# Altium footprint library heromap.PcbLib: 593 footprints (part 35 of 38)
Each footprint in its own frame and in the unit in brackets; x right, y up, seen from the top. Pads: shape width x height; smd on the part's side, far side on the other; paste and mask are expansions set on the pad; w line width, h text height; cw(c..) or ccw(c..) is an arc to the next point about the centre after c.
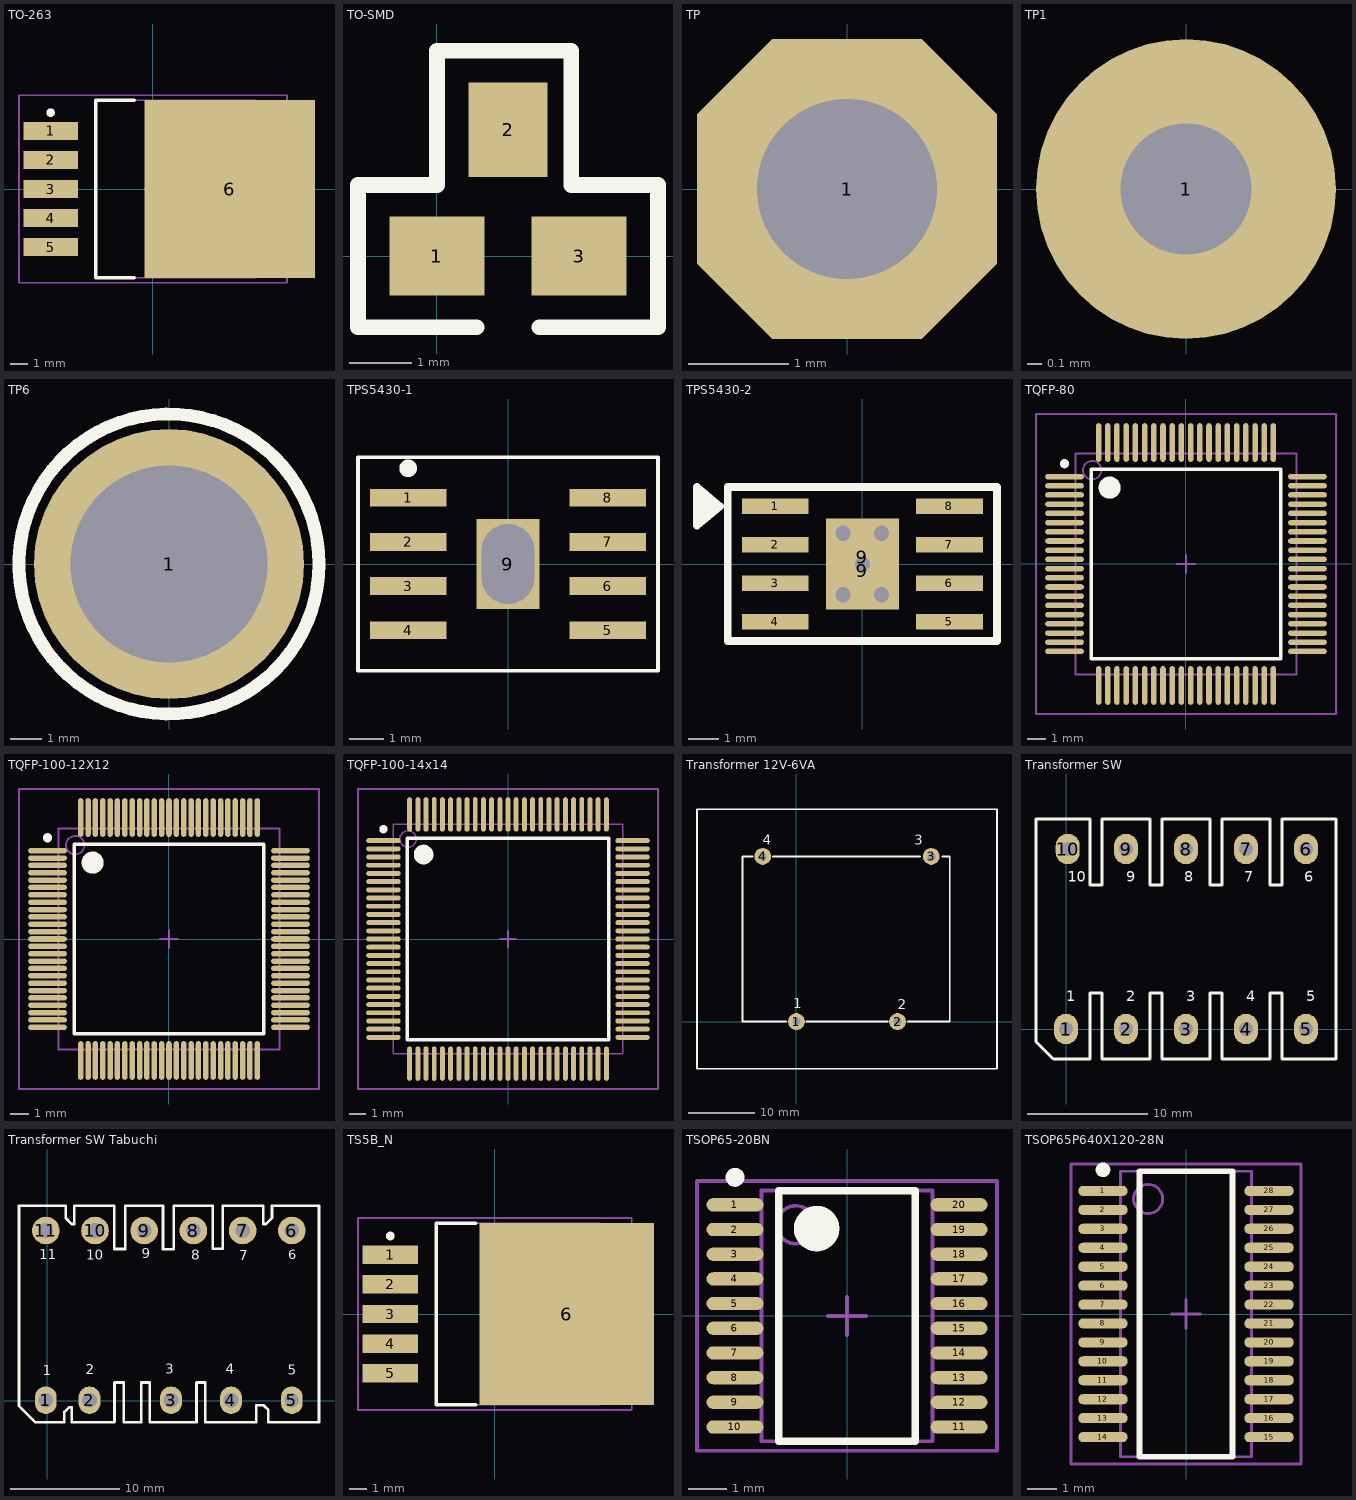
[diagram p34: the footprints below, top view; thin cyan lines are the x and y axes]

## TO-263 [mm]
pads (6):
  rect 3.2x1.05 smd: 1(-6,3.4) 2(-6,1.7) 3(-6,0) 4(-6,-1.7) 5(-6,-3.4)
  rect 10x10.45 smd: 6(4.5,0)
Top Overlay:
  circle w0.25: c-6,4.475 r0.125
  lines w0.2: -1.1,-5.2 -3.35,-5.2 -3.35,5.2 -1.1,5.2
Mechanical 13:
  lines w0.1: -3.35,-5.2 6.05,-5.2 6.05,5.2 -3.35,5.2 -3.35,-5.2
Mechanical 15:
  lines w0.1: -0.5,0 0.5,0 ; 0,-0.5 0,0.5 ; -7.85,-5.5 7.85,-5.5 7.85,5.5 -7.85,5.5 -7.85,-5.5
3D body: height 4.65, standoff 0, extent -3.35,-5.2 6.05,5.2
3D body: height 0.5, standoff 0, extent -6.566,2.832 -4.305,3.924
3D body: height 2, standoff 0, extent -4.953,2.832 -4.293,3.924
3D body: height 2, standoff 1.5, extent -4.953,2.845 -3.251,3.937
3D body: height 2, standoff 1.5, extent -4.966,1.156 -3.264,2.248
3D body: height 2, standoff 0, extent -4.966,1.143 -4.305,2.235
3D body: height 0.5, standoff 0, extent -6.579,1.143 -4.318,2.235
3D body: height 0.5, standoff 0, extent -6.553,-2.286 -4.293,-1.194
3D body: height 2, standoff 0, extent -4.94,-2.286 -4.28,-1.194
3D body: height 2, standoff 1.5, extent -4.94,-2.273 -3.238,-1.181
3D body: height 2, standoff 1.5, extent -4.928,-0.584 -3.226,0.508
3D body: height 2, standoff 0, extent -4.928,-0.597 -4.267,0.495
3D body: height 0.5, standoff 0, extent -6.54,-0.597 -4.28,0.495
3D body: height 2, standoff 1.5, extent -4.953,-3.937 -3.251,-2.845
3D body: height 2, standoff 0, extent -4.953,-3.95 -4.293,-2.857
3D body: height 0.5, standoff 0, extent -6.566,-3.95 -4.305,-2.857
3D body: height 0.5, standoff 0, extent 6.05,-5.2 7.569,5.2

## TO-SMD [mil]
pads (3):
  rect 60x50 smd: 1(0,0) 3(90,0)
  rect 50x60 smd: 2(45,80)
Top Overlay:
  lines w10: 25,-45 -50,-45 -50,45 0,45 0,115 0,130 85,130 85,115 85,45 140,45 140,-45 65,-45

## TP [mm] "Connect 1"
pads (1):
  oct 3x3 hole 1.8: 1(0,0)

## TP1 [mil] "Test point"
height 150
pads (1):
  round 80 hole 35: 1(0,0)

## TP6 [mm] "Jac cap 6ly"
height 3.81
pads (1):
  round 8.5 hole 6.2: 1(0,0)
Top Overlay:
  circle w0.406: c0,0 r4.724

## TPS5430-1 [mm]
pads (9):
  rect 2.2x0.508 smd: 1(-2.875,1.905) 2(-2.875,0.635) 3(-2.875,-0.635) 4(-2.875,-1.905) 5(2.875,-1.905) 6(2.875,-0.635) 7(2.875,0.635) 8(2.875,1.905)
  rect 1.8x2.6 hole 1.5 slot 2.3 at 90 deg: 9(0,0)
Top Overlay:
  circle w0.254: c-2.875,2.755 r0.127
  lines w0.102: -4.318,-3.069 -4.318,3.069 4.318,3.069 4.318,-3.069 -4.318,-3.069
3D body: height 1.69, standoff 0, extent -1.544,1.041 -0.546,2.039
3D body: height 1.68, standoff 0.25, extent -1.995,-2.49 1.995,2.49
3D body: height 0.89, standoff 0.79, extent -2.286,1.676 -1.778,2.134
3D body: height 0.89, standoff 0, extent -2.388,1.676 -2.286,2.134
3D body: height 0.1, standoff 0, extent -3.327,1.676 -2.388,2.134
3D body: height 0.1, standoff 0, extent -3.327,0.406 -2.388,0.864
3D body: height 0.89, standoff 0, extent -2.388,0.406 -2.286,0.864
3D body: height 0.89, standoff 0.79, extent -2.286,0.406 -1.778,0.864
3D body: height 0.1, standoff 0, extent -3.327,-0.864 -2.388,-0.406
3D body: height 0.89, standoff 0, extent -2.388,-0.864 -2.286,-0.406
3D body: height 0.89, standoff 0.79, extent -2.286,-0.864 -1.778,-0.406
3D body: height 0.1, standoff 0, extent -3.327,-2.134 -2.388,-1.676
3D body: height 0.89, standoff 0, extent -2.388,-2.134 -2.286,-1.676
3D body: height 0.89, standoff 0.79, extent -2.286,-2.134 -1.778,-1.676
3D body: height 0.89, standoff 0.79, extent 1.778,1.676 2.286,2.134
3D body: height 0.89, standoff 0, extent 2.286,1.676 2.388,2.134
3D body: height 0.1, standoff 0, extent 2.388,1.676 3.327,2.134
3D body: height 0.89, standoff 0.79, extent 1.778,0.406 2.286,0.864
3D body: height 0.89, standoff 0, extent 2.286,0.406 2.388,0.864
3D body: height 0.1, standoff 0, extent 2.388,0.406 3.327,0.864
3D body: height 0.89, standoff 0.79, extent 1.778,-0.864 2.286,-0.406
3D body: height 0.89, standoff 0, extent 2.286,-0.864 2.388,-0.406
3D body: height 0.1, standoff 0, extent 2.388,-0.864 3.327,-0.406
3D body: height 0.1, standoff 0, extent 2.388,-2.134 3.327,-1.676
3D body: height 0.89, standoff 0, extent 2.286,-2.134 2.388,-1.676
3D body: height 0.89, standoff 0.79, extent 1.778,-2.134 2.286,-1.676

## TPS5430-2 [mm]
pads (10):
  rect 2.2x0.508 smd: 1(-2.875,1.905) 2(-2.875,0.635) 3(-2.875,-0.635) 4(-2.875,-1.905) 5(2.875,-1.905) 6(2.875,-0.635) 7(2.875,0.635) 8(2.875,1.905)
  rect 2.413x2.54 smd: 9(0,-0.229) 9(0,0.229)
via -0.635,1.016 diameter 0.9 hole 0.5
via 0.635,-1.016 diameter 0.9 hole 0.5
via 0.635,1.016 diameter 0.9 hole 0.5
via -0.635,-1.016 diameter 0.9 hole 0.5
via 0,0 diameter 0.9 hole 0.5
Top Overlay:
  region: -4.699,1.905 -5.461,2.54 -5.461,1.27
  lines w0.254: -5.461,1.27 -4.699,1.905 -5.461,2.54 -5.461,1.27 ; -4.445,-2.54 -4.445,2.54 4.445,2.54 4.445,-2.54 -4.445,-2.54
3D body: height 1.69, standoff 0, extent -1.554,1.031 -0.536,2.049
3D body: height 1.68, standoff 0.25, extent -1.995,-2.49 1.995,2.49
3D body: height 0.89, standoff 0.79, extent -2.286,1.676 -1.778,2.134
3D body: height 0.89, standoff 0, extent -2.388,1.676 -2.286,2.134
3D body: height 0.1, standoff 0, extent -3.327,1.676 -2.388,2.134
3D body: height 0.1, standoff 0, extent -3.327,0.406 -2.388,0.864
3D body: height 0.89, standoff 0, extent -2.388,0.406 -2.286,0.864
3D body: height 0.89, standoff 0.79, extent -2.286,0.406 -1.778,0.864
3D body: height 0.1, standoff 0, extent -3.327,-0.864 -2.388,-0.406
3D body: height 0.89, standoff 0, extent -2.388,-0.864 -2.286,-0.406
3D body: height 0.89, standoff 0.79, extent -2.286,-0.864 -1.778,-0.406
3D body: height 0.1, standoff 0, extent -3.327,-2.134 -2.388,-1.676
3D body: height 0.89, standoff 0, extent -2.388,-2.134 -2.286,-1.676
3D body: height 0.89, standoff 0.79, extent -2.286,-2.134 -1.778,-1.676
3D body: height 0.89, standoff 0.79, extent 1.778,1.676 2.286,2.134
3D body: height 0.89, standoff 0, extent 2.286,1.676 2.388,2.134
3D body: height 0.1, standoff 0, extent 2.388,1.676 3.327,2.134
3D body: height 0.89, standoff 0.79, extent 1.778,0.406 2.286,0.864
3D body: height 0.89, standoff 0, extent 2.286,0.406 2.388,0.864
3D body: height 0.1, standoff 0, extent 2.388,0.406 3.327,0.864
3D body: height 0.89, standoff 0.79, extent 1.778,-0.864 2.286,-0.406
3D body: height 0.89, standoff 0, extent 2.286,-0.864 2.388,-0.406
3D body: height 0.1, standoff 0, extent 2.388,-0.864 3.327,-0.406
3D body: height 0.1, standoff 0, extent 2.388,-2.134 3.327,-1.676
3D body: height 0.89, standoff 0, extent 2.286,-2.134 2.388,-1.676
3D body: height 0.89, standoff 0.79, extent 1.778,-2.134 2.286,-1.676

## TQFP-80 [mm] "Thin QFP, 80-Leads, Body 12x12mm, Pitch 0.5mm, IPC Low Density"
height 1.2
pads (80):
  oval 2.1x0.3 smd: 1(-6.6,4.75) 2(-6.6,4.25) 3(-6.6,3.75) 4(-6.6,3.25) 5(-6.6,2.75) 6(-6.6,2.25) 7(-6.6,1.75) 8(-6.6,1.25) 9(-6.6,0.75) 10(-6.6,0.25) 11(-6.6,-0.25) 12(-6.6,-0.75) 13(-6.6,-1.25) 14(-6.6,-1.75) 15(-6.6,-2.25) 16(-6.6,-2.75) 17(-6.6,-3.25) 18(-6.6,-3.75) 19(-6.6,-4.25) 20(-6.6,-4.75) 41(6.6,-4.75) 42(6.6,-4.25) 43(6.6,-3.75) 44(6.6,-3.25) 45(6.6,-2.75) 46(6.6,-2.25) 47(6.6,-1.75) 48(6.6,-1.25) 49(6.6,-0.75) 50(6.6,-0.25) 51(6.6,0.25) 52(6.6,0.75) 53(6.6,1.25) 54(6.6,1.75) 55(6.6,2.25) 56(6.6,2.75) 57(6.6,3.25) 58(6.6,3.75) 59(6.6,4.25) 60(6.6,4.75)
  oval 0.3x2.1 smd: 21(-4.75,-6.6) 22(-4.25,-6.6) 23(-3.75,-6.6) 24(-3.25,-6.6) 25(-2.75,-6.6) 26(-2.25,-6.6) 27(-1.75,-6.6) 28(-1.25,-6.6) 29(-0.75,-6.6) 30(-0.25,-6.6) 31(0.25,-6.6) 32(0.75,-6.6) 33(1.25,-6.6) 34(1.75,-6.6) 35(2.25,-6.6) 36(2.75,-6.6) 37(3.25,-6.6) 38(3.75,-6.6) 39(4.25,-6.6) 40(4.75,-6.6) 61(4.75,6.6) 62(4.25,6.6) 63(3.75,6.6) 64(3.25,6.6) 65(2.75,6.6) 66(2.25,6.6) 67(1.75,6.6) 68(1.25,6.6) 69(0.75,6.6) 70(0.25,6.6) 71(-0.25,6.6) 72(-0.75,6.6) 73(-1.25,6.6) 74(-1.75,6.6) 75(-2.25,6.6) 76(-2.75,6.6) 77(-3.25,6.6) 78(-3.75,6.6) 79(-4.25,6.6) 80(-4.75,6.6)
Top Overlay:
  circle w0.6: c-4.15,4.15 r0.3
  circle w0.25: c-6.6,5.45 r0.125
  lines w0.2: -5.15,-5.15 5.15,-5.15 5.15,5.15 -5.15,5.15 -5.15,-5.15
Mechanical 13:
  circle w0.1: c-5.1,5.1 r0.5
  lines w0.1: -6,-6 6,-6 6,6 -6,6 -6,-6
Mechanical 15:
  lines w0.1: -0.5,0 0.5,0 ; 0,-0.5 0,0.5 ; -8.15,-8.15 8.15,-8.15 8.15,8.15 -8.15,8.15 -8.15,-8.15
3D body: height 1.2, standoff 0, extent -6,-6 6,6

## TQFP-100-12X12 [mm] "Shrink QFP, 100-Leads, Body 12x12mm, Pitch 0.4mm, IPC High Density"
height 2.2
pads (100):
  oval 2.1x0.3 smd: 1(-6.6,4.8) 2(-6.6,4.4) 3(-6.6,4) 4(-6.6,3.6) 5(-6.6,3.2) 6(-6.6,2.8) 7(-6.6,2.4) 8(-6.6,2) 9(-6.6,1.6) 10(-6.6,1.2) 11(-6.6,0.8) 12(-6.6,0.4) 13(-6.6,0) 14(-6.6,-0.4) 15(-6.6,-0.8) 16(-6.6,-1.2) 17(-6.6,-1.6) 18(-6.6,-2) 19(-6.6,-2.4) 20(-6.6,-2.8) 21(-6.6,-3.2) 22(-6.6,-3.6) 23(-6.6,-4) 24(-6.6,-4.4) 25(-6.6,-4.8) 51(6.6,-4.8) 52(6.6,-4.4) 53(6.6,-4) 54(6.6,-3.6) 55(6.6,-3.2) 56(6.6,-2.8) 57(6.6,-2.4) 58(6.6,-2) 59(6.6,-1.6) 60(6.6,-1.2) 61(6.6,-0.8) 62(6.6,-0.4) 63(6.6,0) 64(6.6,0.4) 65(6.6,0.8) 66(6.6,1.2) 67(6.6,1.6) 68(6.6,2) 69(6.6,2.4) 70(6.6,2.8) 71(6.6,3.2) 72(6.6,3.6) 73(6.6,4) 74(6.6,4.4) 75(6.6,4.8)
  oval 0.3x2.1 smd: 26(-4.8,-6.6) 27(-4.4,-6.6) 28(-4,-6.6) 29(-3.6,-6.6) 30(-3.2,-6.6) 31(-2.8,-6.6) 32(-2.4,-6.6) 33(-2,-6.6) 34(-1.6,-6.6) 35(-1.2,-6.6) 36(-0.8,-6.6) 37(-0.4,-6.6) 38(0,-6.6) 39(0.4,-6.6) 40(0.8,-6.6) 41(1.2,-6.6) 42(1.6,-6.6) 43(2,-6.6) 44(2.4,-6.6) 45(2.8,-6.6) 46(3.2,-6.6) 47(3.6,-6.6) 48(4,-6.6) 49(4.4,-6.6) 50(4.8,-6.6) 76(4.8,6.6) 77(4.4,6.6) 78(4,6.6) 79(3.6,6.6) 80(3.2,6.6) 81(2.8,6.6) 82(2.4,6.6) 83(2,6.6) 84(1.6,6.6) 85(1.2,6.6) 86(0.8,6.6) 87(0.4,6.6) 88(0,6.6) 89(-0.4,6.6) 90(-0.8,6.6) 91(-1.2,6.6) 92(-1.6,6.6) 93(-2,6.6) 94(-2.4,6.6) 95(-2.8,6.6) 96(-3.2,6.6) 97(-3.6,6.6) 98(-4,6.6) 99(-4.4,6.6) 100(-4.8,6.6)
Top Overlay:
  circle w0.25: c-6.6,5.5 r0.125
  circle w0.6: c-4.15,4.15 r0.3
  lines w0.2: -5.15,-5.15 -5.15,5.15 5.15,5.15 5.15,-5.15 -5.15,-5.15
Mechanical 13:
  circle w0.1: c-5.1,5.1 r0.5
  lines w0.1: -6,-6 -6,6 6,6 6,-6 -6,-6
Mechanical 15:
  lines w0.1: -0.5,0 0.5,0 ; 0,-0.5 0,0.5 ; -8.15,-8.15 -8.15,8.15 8.15,8.15 8.15,-8.15 -8.15,-8.15
3D body: height 2.2, standoff 0, extent -6,-6 6,6

## TQFP-100-14x14 [mm] "Thin QFP, 100-Leads, Body 14x14mm, Pitch 0.5mm, IPC Low Density"
height 1.6
pads (100):
  oval 2.1x0.3 smd: 1(-7.6,6) 2(-7.6,5.5) 3(-7.6,5) 4(-7.6,4.5) 5(-7.6,4) 6(-7.6,3.5) 7(-7.6,3) 8(-7.6,2.5) 9(-7.6,2) 10(-7.6,1.5) 11(-7.6,1) 12(-7.6,0.5) 13(-7.6,0) 14(-7.6,-0.5) 15(-7.6,-1) 16(-7.6,-1.5) 17(-7.6,-2) 18(-7.6,-2.5) 19(-7.6,-3) 20(-7.6,-3.5) 21(-7.6,-4) 22(-7.6,-4.5) 23(-7.6,-5) 24(-7.6,-5.5) 25(-7.6,-6) 51(7.6,-6) 52(7.6,-5.5) 53(7.6,-5) 54(7.6,-4.5) 55(7.6,-4) 56(7.6,-3.5) 57(7.6,-3) 58(7.6,-2.5) 59(7.6,-2) 60(7.6,-1.5) 61(7.6,-1) 62(7.6,-0.5) 63(7.6,0) 64(7.6,0.5) 65(7.6,1) 66(7.6,1.5) 67(7.6,2) 68(7.6,2.5) 69(7.6,3) 70(7.6,3.5) 71(7.6,4) 72(7.6,4.5) 73(7.6,5) 74(7.6,5.5) 75(7.6,6)
  oval 0.3x2.1 smd: 26(-6,-7.6) 27(-5.5,-7.6) 28(-5,-7.6) 29(-4.5,-7.6) 30(-4,-7.6) 31(-3.5,-7.6) 32(-3,-7.6) 33(-2.5,-7.6) 34(-2,-7.6) 35(-1.5,-7.6) 36(-1,-7.6) 37(-0.5,-7.6) 38(0,-7.6) 39(0.5,-7.6) 40(1,-7.6) 41(1.5,-7.6) 42(2,-7.6) 43(2.5,-7.6) 44(3,-7.6) 45(3.5,-7.6) 46(4,-7.6) 47(4.5,-7.6) 48(5,-7.6) 49(5.5,-7.6) 50(6,-7.6) 76(6,7.6) 77(5.5,7.6) 78(5,7.6) 79(4.5,7.6) 80(4,7.6) 81(3.5,7.6) 82(3,7.6) 83(2.5,7.6) 84(2,7.6) 85(1.5,7.6) 86(1,7.6) 87(0.5,7.6) 88(0,7.6) 89(-0.5,7.6) 90(-1,7.6) 91(-1.5,7.6) 92(-2,7.6) 93(-2.5,7.6) 94(-3,7.6) 95(-3.5,7.6) 96(-4,7.6) 97(-4.5,7.6) 98(-5,7.6) 99(-5.5,7.6) 100(-6,7.6)
Top Overlay:
  circle w0.25: c-7.6,6.7 r0.125
  circle w0.6: c-5.15,5.15 r0.3
  lines w0.2: -6.15,-6.15 -6.15,6.15 6.15,6.15 6.15,-6.15 -6.15,-6.15
Mechanical 13:
  circle w0.1: c-6.1,6.1 r0.5
  lines w0.1: -7,-7 -7,7 7,7 7,-7 -7,-7
Mechanical 15:
  lines w0.1: -0.5,0 0.5,0 ; 0,-0.5 0,0.5 ; -9.15,-9.15 -9.15,9.15 9.15,9.15 9.15,-9.15 -9.15,-9.15
3D body: height 1.6, standoff 0, extent -7,-7 7,7

## Transformer 12V-6VA [mm] "Transformer; 4 Leads"
pads (4):
  round 2.54 hole 1.2: 1(0,0) 2(15.24,0) 3(20.32,24.892) 4(-5.08,24.892)
Top Overlay:
  lines w0.254: -6.604,24.892 -8.128,24.892 -8.128,24.638 -8.128,0.254 -8.128,0 -1.524,0 ; -3.556,24.892 18.669,24.892 ; 1.524,0 13.716,0 ; 16.764,0 23.114,0 23.114,0.254 23.114,24.638 23.114,24.892 21.971,24.892 ; -14.986,-7.112 -14.986,32.004 30.226,32.004 30.226,-7.112 -14.986,-7.112
  text "3" at 17.78,26.67 h1.5
  text "4" at -5.08,26.67 h1.5
  text "2" at 15.24,1.882 h1.5
  text "1" at -0.508,2.032 h1.5
3D body: height 31, standoff 20, extent -8.128,0 23.114,24.892
3D body: height 26, standoff 1, extent -14.986,-7.112 30.226,32.004
3D body: height 1, standoff -4, extent -5.576,24.393 -4.58,25.391
3D body: height 1, standoff -4, extent 19.824,24.393 20.82,25.391
3D body: height 1, standoff -4, extent 14.744,-0.499 15.74,0.499
3D body: height 1, standoff -4, extent -0.496,-0.499 0.5,0.499

## Transformer SW [mm] "Transformer; 4 Leads"
pads (10):
  oval 2x2.54 hole 1.2: 1(0,0) 2(5,0) 3(10,0) 4(15,0) 5(20,0) 6(20,15) 7(15,15) 8(10,15) 9(5,15) 10(0.142,15)
Top Overlay:
  lines w0.254: -2.5,-1.056 -2.5,17.5 2,17.5 2,12 3,12 3,17.5 7,17.5 7,12 8,12 8,17.5 12,17.5 12,12 13,12 13,17.5 17,17.5 17,12 18,12 18,17.5 22.5,17.5 22.5,-2.5 18,-2.5 18,3 17,3 17,-2.5 13,-2.5 13,3 12,3 12,-2.5 8,-2.5 8,3 7,3 7,-2.5 3,-2.5 3,3 2,3 2,-2.5 -1.056,-2.5 -2.5,-1.056
  text "10" at 0.142,12 h1.52
  text "9" at 5,12 h1.52
  text "8" at 9.873,12 h1.52
  text "7" at 14.873,12 h1.52
  text "6" at 19.873,12 h1.52
  text "5" at 20,2 h1.52
  text "4" at 15,2 h1.52
  text "3" at 10,2.032 h1.52
  text "2" at 5,2.032 h1.52
  text "1" at 0,2.032 h1.5
3D body: height 1, standoff -4, extent -0.496,-0.499 0.5,0.499

## Transformer SW Tabuchi [mil] "Transformer; 4 Leads"
pads (11):
  oval 78.74x100 hole 53.15: 1(-5,1) 2(153,1) 3(448,1) 4(665,1) 5(885,1)
  round 100 hole 53.15: 6(885,615) 7(707,615) 8(529,615) 9(351,615) 10(173,615) 11(-5,615)
Top Overlay:
  lines w10: 89,-79 243,-79 ; 89,-77 89,-24 80,-24 62,-42 62,-79 -43,-79 -102,-20 -102,705 67,705 67,660 88,639 98,639 98,705 243,705 243,548 282,548 282,705 419,705 419,547 458,547 458,705 599,705 599,549 635,549 635,705 782,705 782,639 792,639 813,660 813,705 983.43,705 983.43,-79 800,-79 800,-34 783,-17 756,-17 756,-79 572,-79 572,65 540,65 540,-79 371,-79 371,65 340,65 340,-79 277,-79 277,65 244,65 244,-68.98 244,-76 243,-77
  text "11" at -28,498 h60
  text "5" at 871,80 h60
  text "4" at 646,84 h60
  text "3" at 428,85 h60
  text "2" at 140,82 h60
  text "1" at -16,78 h60
  text "10" at 141,497 h60
  text "9" at 343,502 h60
  text "8" at 521,496 h60
  text "7" at 694,494 h60
  text "6" at 873,499 h59.06
3D body: height 748.03, standoff 236.22, extent 80.5,-80 800.5,700
3D body: height 39.37, standoff -157.48, extent 687.31,595.36 726.53,634.64
3D body: height 39.37, standoff -157.48, extent 509.31,595.36 548.53,634.64
3D body: height 39.37, standoff -157.48, extent 331.31,595.36 370.53,634.64
3D body: height 39.37, standoff -157.48, extent 153.31,595.36 192.53,634.64
3D body: height 39.37, standoff -157.48, extent -24.69,595.36 14.53,634.64
3D body: height 39.37, standoff -157.48, extent -24.69,-18.64 14.53,20.64
3D body: height 39.37, standoff -157.48, extent 133.31,-18.64 172.53,20.64
3D body: height 39.37, standoff -157.48, extent 428.31,-18.64 467.53,20.64
3D body: height 39.37, standoff -157.48, extent 645.31,-18.64 684.53,20.64
3D body: height -748.03, standoff -826.77, extent -103,-80 984,705
3D body: height 39.37, standoff -157.48, extent 865.31,-18.64 904.53,20.64
3D body: height 39.37, standoff -157.48, extent 865.31,595.36 904.53,634.64
3D body: height -39.37, standoff -196.85, extent -103,-80 984,705
3D body: height 830.71, standoff 39.37, extent -110,230 990,420

## TS5B_N [mm]
pads (6):
  rect 3.2x1.05 smd: 1(-6,3.4) 2(-6,1.7) 3(-6,0) 4(-6,-1.7) 5(-6,-3.4)
  rect 10x10.45 smd: 6(4.131,0)
Top Overlay:
  circle w0.25: c-6,4.475 r0.125
  lines w0.2: -1.1,-5.2 -3.35,-5.2 -3.35,5.2 -1.1,5.2
Mechanical 13:
  lines w0.1: -3.35,-5.2 6.05,-5.2 6.05,5.2 -3.35,5.2 -3.35,-5.2
Mechanical 15:
  lines w0.1: -0.5,0 0.5,0 ; 0,-0.5 0,0.5 ; -7.85,-5.5 7.85,-5.5 7.85,5.5 -7.85,5.5 -7.85,-5.5
3D body: height 4.65, standoff 0, extent -3.35,-5.2 6.05,5.2
3D body: height 0.5, standoff 0, extent -6.566,2.832 -4.305,3.924
3D body: height 2, standoff 0, extent -4.953,2.832 -4.293,3.924
3D body: height 2, standoff 1.5, extent -4.953,2.845 -3.251,3.937
3D body: height 2, standoff 1.5, extent -4.966,1.156 -3.264,2.248
3D body: height 2, standoff 0, extent -4.966,1.143 -4.305,2.235
3D body: height 0.5, standoff 0, extent -6.579,1.143 -4.318,2.235
3D body: height 0.5, standoff 0, extent -6.553,-2.286 -4.293,-1.194
3D body: height 2, standoff 0, extent -4.94,-2.286 -4.28,-1.194
3D body: height 2, standoff 1.5, extent -4.94,-2.273 -3.238,-1.181
3D body: height 2, standoff 1.5, extent -4.928,-0.584 -3.226,0.508
3D body: height 2, standoff 0, extent -4.928,-0.597 -4.267,0.495
3D body: height 0.5, standoff 0, extent -6.54,-0.597 -4.28,0.495
3D body: height 2, standoff 1.5, extent -4.953,-3.937 -3.251,-2.845
3D body: height 2, standoff 0, extent -4.953,-3.95 -4.293,-2.857
3D body: height 0.5, standoff 0, extent -6.566,-3.95 -4.305,-2.857

## TSOP65-20BN [mm] "TSOP, 20-Leads, Body 6.5x4.4mm, Pitch 0.65mm, IPC Medium Density"
height 1.2
pads (20):
  oval 1.5x0.35 smd: 1(-2.95,2.925) 2(-2.95,2.275) 3(-2.95,1.625) 4(-2.95,0.975) 5(-2.95,0.325) 6(-2.95,-0.325) 7(-2.95,-0.975) 8(-2.95,-1.625) 9(-2.95,-2.275) 10(-2.95,-2.925) 11(2.95,-2.925) 12(2.95,-2.275) 13(2.95,-1.625) 14(2.95,-0.975) 15(2.95,-0.325) 16(2.95,0.325) 17(2.95,0.975) 18(2.95,1.625) 19(2.95,2.275) 20(2.95,2.925)
Top Overlay:
  circle w0.25: c-2.95,3.65 r0.125
  circle w0.6: c-0.8,2.3 r0.3
  lines w0.2: -1.8,-3.3 -1.8,3.3 1.8,3.3 1.8,-3.3 -1.8,-3.3
Mechanical 13:
  circle w0.1: c-1.35,2.4 r0.5
  lines w0.1: -2.25,-3.3 -2.25,3.3 2.25,3.3 2.25,-3.3 -2.25,-3.3
Mechanical 15:
  lines w0.1: -0.5,0 0.5,0 ; 0,-0.5 0,0.5 ; -3.95,-3.55 -3.95,3.55 3.95,3.55 3.95,-3.55 -3.95,-3.55
3D body: height 1.2, standoff 0, extent -2.25,-3.3 2.25,3.3

## TSOP65P640X120-28N [mm] "TSOP, 28-Leads, Body 9,8x4,5mm (max), Pitch 0,65mm, IPC Medium Density"
height 1.2
pads (28):
  oval 1.7x0.35 smd: 1(-2.85,4.225) 2(-2.85,3.575) 3(-2.85,2.925) 4(-2.85,2.275) 5(-2.85,1.625) 6(-2.85,0.975) 7(-2.85,0.325) 8(-2.85,-0.325) 9(-2.85,-0.975) 10(-2.85,-1.625) 11(-2.85,-2.275) 12(-2.85,-2.925) 13(-2.85,-3.575) 14(-2.85,-4.225) 15(2.85,-4.225) 16(2.85,-3.575) 17(2.85,-2.925) 18(2.85,-2.275) 19(2.85,-1.625) 20(2.85,-0.975) 21(2.85,-0.325) 22(2.85,0.325) 23(2.85,0.975) 24(2.85,1.625) 25(2.85,2.275) 26(2.85,2.925) 27(2.85,3.575) 28(2.85,4.225)
Top Overlay:
  circle w0.25: c-2.85,4.95 r0.125
  lines w0.2: -1.6,-4.9 1.6,-4.9 1.6,4.9 -1.6,4.9 -1.6,-4.9
Mechanical 13:
  circle w0.1: c-1.3,3.95 r0.5
  lines w0.1: -2.25,-4.9 2.25,-4.9 2.25,4.9 -2.25,4.9 -2.25,-4.9
Mechanical 15:
  lines w0.1: -0.5,0 0.5,0 ; 0,-0.5 0,0.5 ; -3.95,-5.15 3.95,-5.15 3.95,5.15 -3.95,5.15 -3.95,-5.15
3D body: height 1.2, standoff 0.1, extent -2.25,-4.9 2.25,4.9
3D body: height 0.3, standoff 0.1, extent -3.453,-4.39 -2.767,-4.06
3D body: height 0.7, standoff 0.5, extent -2.932,-4.39 -2.247,-4.06
3D body: height 0.7, standoff 0.1, extent -2.932,-4.39 -2.767,-4.06
3D body: height 0.3, standoff 0.1, extent -3.453,-3.74 -2.767,-3.41
3D body: height 0.7, standoff 0.5, extent -2.932,-3.74 -2.247,-3.41
3D body: height 0.7, standoff 0.1, extent -2.932,-3.74 -2.767,-3.41
3D body: height 0.7, standoff 0.1, extent 2.767,-4.39 2.932,-4.06
3D body: height 0.7, standoff 0.5, extent 2.247,-4.39 2.932,-4.06
3D body: height 0.3, standoff 0.1, extent 2.767,-4.39 3.453,-4.06
3D body: height 0.7, standoff 0.1, extent 2.767,-3.74 2.932,-3.41
3D body: height 0.7, standoff 0.5, extent 2.247,-3.74 2.932,-3.41
3D body: height 0.3, standoff 0.1, extent 2.767,-3.74 3.453,-3.41
3D body: height 0.3, standoff 0.1, extent 2.718,-3.094 3.404,-2.764
3D body: height 0.7, standoff 0.5, extent 2.197,-3.094 2.883,-2.764
3D body: height 0.7, standoff 0.1, extent 2.718,-3.094 2.883,-2.764
3D body: height 0.7, standoff 0.1, extent 2.767,-2.44 2.932,-2.11
3D body: height 0.7, standoff 0.5, extent 2.247,-2.44 2.932,-2.11
3D body: height 0.3, standoff 0.1, extent 2.767,-2.44 3.453,-2.11
3D body: height 0.7, standoff 0.1, extent 2.767,-1.79 2.932,-1.46
3D body: height 0.7, standoff 0.5, extent 2.247,-1.79 2.932,-1.46
3D body: height 0.3, standoff 0.1, extent 2.767,-1.79 3.453,-1.46
3D body: height 0.7, standoff 0.1, extent 2.767,-1.14 2.932,-0.81
3D body: height 0.7, standoff 0.5, extent 2.247,-1.14 2.932,-0.81
3D body: height 0.3, standoff 0.1, extent 2.767,-1.14 3.453,-0.81
3D body: height 0.3, standoff 0.1, extent 2.718,-0.494 3.404,-0.164
3D body: height 0.7, standoff 0.5, extent 2.197,-0.494 2.883,-0.164
3D body: height 0.7, standoff 0.1, extent 2.718,-0.494 2.883,-0.164
3D body: height 0.7, standoff 0.1, extent 2.767,0.16 2.932,0.49
3D body: height 0.7, standoff 0.5, extent 2.247,0.16 2.932,0.49
3D body: height 0.3, standoff 0.1, extent 2.767,0.16 3.453,0.49
3D body: height 0.7, standoff 0.1, extent 2.767,0.81 2.932,1.14
3D body: height 0.7, standoff 0.5, extent 2.247,0.81 2.932,1.14
3D body: height 0.3, standoff 0.1, extent 2.767,0.81 3.453,1.14
3D body: height 0.7, standoff 0.1, extent 2.767,1.46 2.932,1.79
3D body: height 0.7, standoff 0.5, extent 2.247,1.46 2.932,1.79
3D body: height 0.3, standoff 0.1, extent 2.767,1.46 3.453,1.79
3D body: height 0.3, standoff 0.1, extent 2.718,2.106 3.404,2.436
3D body: height 0.7, standoff 0.5, extent 2.197,2.106 2.883,2.436
3D body: height 0.7, standoff 0.1, extent 2.718,2.106 2.883,2.436
3D body: height 0.7, standoff 0.1, extent 2.767,2.76 2.932,3.09
3D body: height 0.7, standoff 0.5, extent 2.247,2.76 2.932,3.09
3D body: height 0.3, standoff 0.1, extent 2.767,2.76 3.453,3.09
3D body: height 0.7, standoff 0.1, extent 2.767,3.41 2.932,3.74
3D body: height 0.7, standoff 0.5, extent 2.247,3.41 2.932,3.74
3D body: height 0.3, standoff 0.1, extent 2.767,3.41 3.453,3.74
3D body: height 0.7, standoff 0.1, extent 2.767,4.06 2.932,4.39
3D body: height 0.7, standoff 0.5, extent 2.247,4.06 2.932,4.39
3D body: height 0.3, standoff 0.1, extent 2.767,4.06 3.453,4.39
3D body: height 0.3, standoff 0.1, extent -3.404,-1.136 -2.718,-0.806
3D body: height 0.7, standoff 0.5, extent -2.883,-1.136 -2.197,-0.806
3D body: height 0.7, standoff 0.1, extent -2.883,-1.136 -2.718,-0.806
3D body: height 0.7, standoff 0.1, extent -2.932,-1.79 -2.767,-1.46
3D body: height 0.7, standoff 0.5, extent -2.932,-1.79 -2.247,-1.46
3D body: height 0.3, standoff 0.1, extent -3.453,-1.79 -2.767,-1.46
3D body: height 0.7, standoff 0.1, extent -2.932,-2.44 -2.767,-2.11
3D body: height 0.7, standoff 0.5, extent -2.932,-2.44 -2.247,-2.11
3D body: height 0.3, standoff 0.1, extent -3.453,-2.44 -2.767,-2.11
3D body: height 0.7, standoff 0.1, extent -2.932,-3.09 -2.767,-2.76
3D body: height 0.7, standoff 0.5, extent -2.932,-3.09 -2.247,-2.76
3D body: height 0.3, standoff 0.1, extent -3.453,-3.09 -2.767,-2.76
3D body: height 0.3, standoff 0.1, extent -3.404,1.464 -2.718,1.794
3D body: height 0.7, standoff 0.5, extent -2.883,1.464 -2.197,1.794
3D body: height 0.7, standoff 0.1, extent -2.883,1.464 -2.718,1.794
3D body: height 0.7, standoff 0.1, extent -2.932,0.81 -2.767,1.14
3D body: height 0.7, standoff 0.5, extent -2.932,0.81 -2.247,1.14
3D body: height 0.3, standoff 0.1, extent -3.453,0.81 -2.767,1.14
3D body: height 0.7, standoff 0.1, extent -2.932,0.16 -2.767,0.49
3D body: height 0.7, standoff 0.5, extent -2.932,0.16 -2.247,0.49
3D body: height 0.3, standoff 0.1, extent -3.453,0.16 -2.767,0.49
3D body: height 0.7, standoff 0.1, extent -2.932,-0.49 -2.767,-0.16
3D body: height 0.7, standoff 0.5, extent -2.932,-0.49 -2.247,-0.16
3D body: height 0.3, standoff 0.1, extent -3.453,-0.49 -2.767,-0.16
3D body: height 0.3, standoff 0.1, extent -3.453,2.11 -2.767,2.44
3D body: height 0.7, standoff 0.5, extent -2.932,2.11 -2.247,2.44
3D body: height 0.7, standoff 0.1, extent -2.932,2.11 -2.767,2.44
3D body: height 0.3, standoff 0.1, extent -3.453,2.76 -2.767,3.09
3D body: height 0.7, standoff 0.5, extent -2.932,2.76 -2.247,3.09
3D body: height 0.7, standoff 0.1, extent -2.932,2.76 -2.767,3.09
3D body: height 0.3, standoff 0.1, extent -3.453,3.41 -2.767,3.74
3D body: height 0.7, standoff 0.5, extent -2.932,3.41 -2.247,3.74
3D body: height 0.7, standoff 0.1, extent -2.932,3.41 -2.767,3.74
3D body: height 0.7, standoff 0.1, extent -2.883,4.064 -2.718,4.394
3D body: height 0.7, standoff 0.5, extent -2.883,4.064 -2.197,4.394
3D body: height 0.3, standoff 0.1, extent -3.404,4.064 -2.718,4.394